# Altium footprint library B105rlc.PcbLib: 103 footprints (part 6 of 7)
Each footprint in its own frame and in the unit in brackets; x right, y up, seen from the top. Pads: shape width x height; smd on the part's side, far side on the other; paste and mask are expansions set on the pad; w line width, h text height; cw(c..) or ccw(c..) is an arc to the next point about the centre after c.
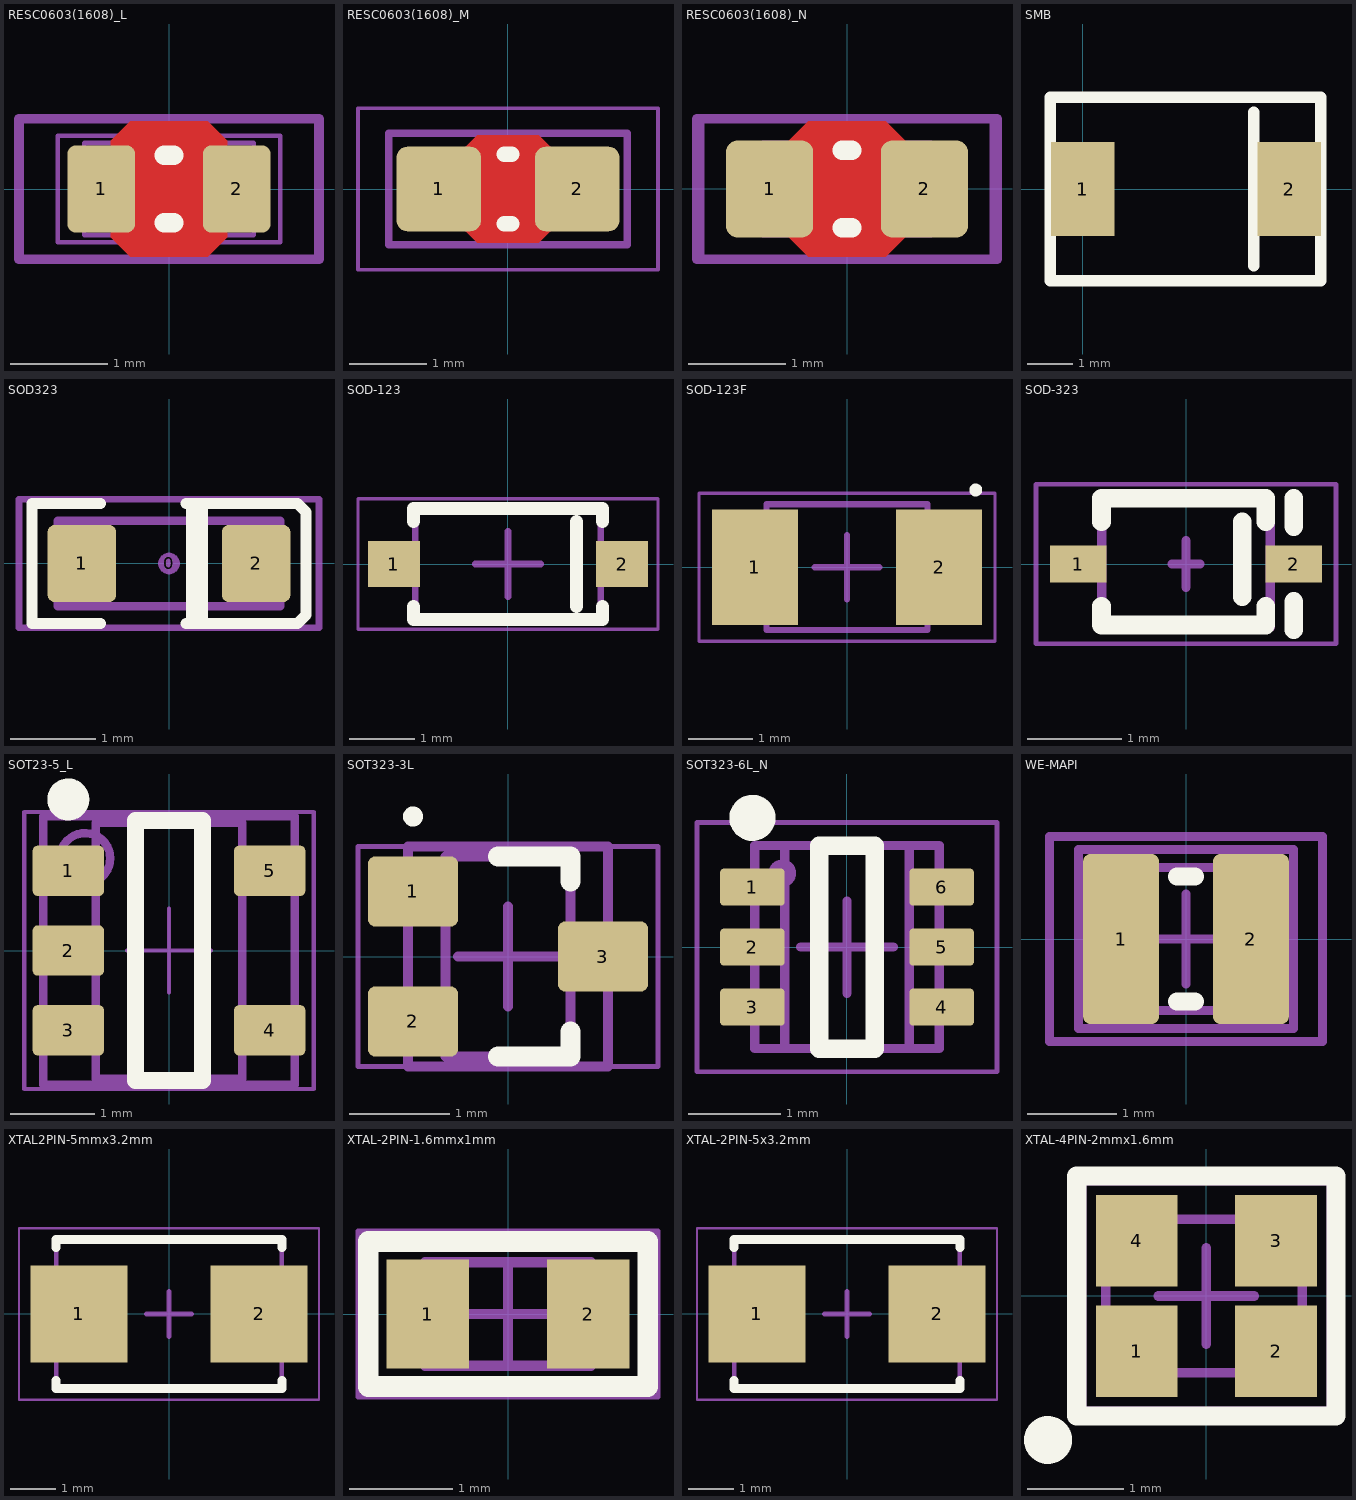
[diagram p5: the footprints below, top view; thin cyan lines are the x and y axes]

## RESC0603(1608)_L [mm] "Chip Resistor, Body 1.6x0.8mm, IPC High Density"
height 0.6
pads (2):
  rrect25% 0.7x0.9 smd: 1(-0.7,0) 2(0.7,0)
Top Layer:
  pour cut-out: -0.6,0.5 -0.4,0.7 0.4,0.7 0.6,0.5 0.6,-0.5 0.4,-0.7 -0.4,-0.7 -0.6,-0.5
Top Overlay:
  lines w0.2: -0.05,-0.35 0.05,-0.35 ; -0.05,0.35 0.05,0.35
Mechanical 5:
  lines w0.1: -1.55,-0.725 -1.55,0.725 1.55,0.725 1.55,-0.725 -1.55,-0.725
  text ".Designator" at -1,-0.381 h0.76
Mechanical 13:
  lines w0.05: -0.875,-0.475 -0.875,0.475 -0.475,0.475 -0.475,-0.475 -0.875,-0.475 ; -0.475,-0.474 0.475,-0.474 -0.475,-0.474 ; -0.475,0.474 0.475,0.474 -0.475,0.474 ; 0.475,-0.475 0.875,-0.475 0.875,0.475 0.475,0.475 0.475,-0.475
Mechanical 15:
  lines w0.05: -0.475,0 0.475,0 ; 0,-0.475 0,0.475 ; -1.15,-0.55 1.15,-0.55 1.15,0.55 -1.15,0.55 -1.15,-0.55
3D body "RES 0603 (1608 metric).STEP": height 0.54, standoff -0.01, extent -0.875,-0.475 0.875,0.475

## RESC0603(1608)_M [mm] "Chip Resistor, Body 1.6x0.8mm, IPC Low Density"
height 0.6
pads (2):
  rrect25% 1.1x1.1 smd: 1(-0.9,0) 2(0.9,0)
Top Layer:
  pour cut-out: -0.6,0.5 -0.4,0.7 0.4,0.7 0.6,0.5 0.6,-0.5 0.4,-0.7 -0.4,-0.7 -0.6,-0.5
Top Overlay:
  lines w0.2: -0.05,-0.45 0.05,-0.45 ; -0.05,0.45 0.05,0.45
Mechanical 5:
  lines w0.1: -1.55,-0.725 1.55,-0.725 1.55,0.725 -1.55,0.725 -1.55,-0.725
  text ".Designator" at -1,-0.381 h0.76
Mechanical 13:
  lines w0.05: -0.875,-0.475 -0.475,-0.475 -0.475,0.475 -0.875,0.475 -0.875,-0.475 ; -0.475,-0.474 0.475,-0.474 -0.475,-0.474 ; -0.475,0.474 0.475,0.474 -0.475,0.474 ; 0.475,-0.475 0.475,0.475 0.875,0.475 0.875,-0.475 0.475,-0.475
Mechanical 15:
  lines w0.05: -0.475,0 0.475,0 ; 0,-0.475 0,0.475 ; -1.95,-1.05 -1.95,1.05 1.95,1.05 1.95,-1.05 -1.95,-1.05
3D body "RES 0603 (1608 metric).STEP": height 0.54, standoff -0.01, extent -0.875,-0.475 0.875,0.475

## RESC0603(1608)_N [mm]
pads (2):
  rrect25% 0.9x1 smd: 1(-0.8,0) 2(0.8,0)
Top Layer:
  pour cut-out: -0.6,0.5 -0.4,0.7 0.4,0.7 0.6,0.5 0.6,-0.5 0.4,-0.7 -0.4,-0.7 -0.6,-0.5
Top Overlay:
  lines w0.2: -0.05,-0.4 0.05,-0.4 ; -0.05,0.4 0.05,0.4
Mechanical 5:
  lines w0.1: -1.55,-0.725 1.55,-0.725 1.55,0.725 -1.55,0.725 -1.55,-0.725
  text ".Designator" at 1,0.4 h0.76
Mechanical 13:
  lines w0.05: -0.875,-0.475 -0.875,0.475 -0.475,0.475 -0.475,-0.475 -0.875,-0.475 ; -0.475,-0.474 0.475,-0.474 -0.475,-0.474 ; -0.475,0.474 0.475,0.474 -0.475,0.474 ; 0.475,-0.475 0.875,-0.475 0.875,0.475 0.475,0.475 0.475,-0.475
Mechanical 15:
  lines w0.05: -0.475,0 0.475,0 ; 0,-0.475 0,0.475 ; -1.5,-0.75 1.5,-0.75 1.5,0.75 -1.5,0.75 -1.5,-0.75
3D body "RES 0603 (1608 metric).STEP": height 0.54, standoff -0.01, extent -0.875,-0.475 0.875,0.475

## SMB [mm]
pads (2):
  rect 1.41x2.08 smd: 1(0,0) 2(4.572,0)
Top Overlay:
  lines w0.254: 3.786,-1.7 3.786,1.7 ; -0.724,-2.032 -0.724,2.032 5.276,2.032 5.276,-2.032 -0.724,-2.032
3D body "User Library-DO-214AA_SMB.step": height 2.2, standoff -0.05, extent -0.364,-1.85 4.936,1.85

## SOD323 [mm]
pads (3):
  round 0.254 on Mech15: 0(0,0)
  rrect20% 0.8x0.9 smd: 1(-1.016,0) 2(1.016,0)
Top Overlay:
  rectangle: 0.2,-0.762 0.454,0.7
  lines w0.127: -0.8,-0.7 -1.6,-0.7 -1.6,0.7 -0.8,0.7 ; 0.2,-0.7 1.5,-0.7 1.6,-0.6 1.6,0.6 1.5,0.7 0.2,0.7
Mechanical 5:
  lines w0.1: 1.1,-0.3 1.1,0.3 ; -1.3,-0.5 -1.3,0.5 1.3,0.5 1.3,-0.5 -1.3,-0.5
  text ".Designator" at -0.9,-0.3 h0.64
Mechanical 15:
  lines w0.076: -1.75,-0.75 1.75,-0.75 1.75,0.75 -1.75,0.75 -1.75,-0.75
3D body "SOD-323.STEP": height 1.1, standoff 0, extent -1.305,-0.675 1.295,0.675

## SOD-123 [mm] "SODFL, 2-Leads, Body 1,55x3,70mm, IPC Medium Density"
height 1.1
pads (2):
  rect 0.8x0.7 smd: 1(-1.75,0) 2(1.75,0)
Top Overlay:
  lines w0.2: -1.45,-0.65 -1.45,-0.85 1.45,-0.85 1.45,-0.65 ; -1.45,0.65 -1.45,0.85 1.45,0.85 1.45,0.65 ; 1.05,-0.65 1.05,0.65
Mechanical 13:
  lines w0.1: -1.425,-0.85 -1.425,0.85 1.425,0.85 1.425,-0.85 -1.425,-0.85
Mechanical 15:
  lines w0.05: -2.3,-1 -2.3,1 2.3,1 2.3,-1 -2.3,-1
  lines w0.1: -0.5,0 0.5,0 ; 0,-0.5 0,0.5
3D body "SOD-123_DiodesInc.step": height 1.42, standoff -0.03, extent -1.925,-0.85 1.925,0.85

## SOD-123F [mm] "SODFL, 2-Leads, Body 1,72x3,60mm, IPC Medium Density"
height 1.08
pads (2):
  rect 1.34x1.8 smd: 1(-1.43,0) 2(1.43,0)
Top Overlay:
  circle w0.1: c2,1.2 r0.05
Mechanical 13:
  lines w0.1: -1.25,-0.975 1.25,-0.975 1.25,0.975 -1.25,0.975 -1.25,-0.975
Mechanical 15:
  lines w0.05: -2.3,-1.15 2.3,-1.15 2.3,1.15 -2.3,1.15 -2.3,-1.15
  lines w0.1: -0.5,0 0.5,0 ; 0,-0.5 0,0.5
3D body "SOD123F.STEP": height 1.2, standoff -0.01, extent -1.875,-0.85 1.875,0.85

## SOD-323 [mm]
pads (2):
  rect 0.6x0.4 smd: 1(-1.15,0) 2(1.15,0)
Top Overlay:
  lines w0.2: -0.9,-0.45 -0.9,-0.65 0.85,-0.65 0.85,-0.45 ; -0.9,0.45 -0.9,0.7 0.85,0.7 0.85,0.45 ; 0.6,-0.35 0.6,0.45 ; 1.15,-0.7 1.15,-0.4 ; 1.15,0.4 1.15,0.7
Mechanical 13:
  lines w0.1: -0.9,-0.675 -0.9,0.675 0.9,0.675 0.9,-0.675 -0.9,-0.675
Mechanical 15:
  lines w0.05: -1.6,-0.85 -1.6,0.85 1.6,0.85 1.6,-0.85 -1.6,-0.85
  lines w0.1: -0.15,0 0.15,0 ; 0,-0.25 0,0.25
3D body "User Library-SOD323-1.step": height 1.1, standoff 0, extent -1.3,-0.675 1.3,0.675

## SOT23-5_L [mm]
pads (5):
  rrect20% 0.85x0.6 smd: 1(-1.2,0.95) 2(-1.2,0) 3(-1.2,-0.95) 4(1.2,-0.95) 5(1.2,0.95)
Top Overlay:
  circle w0.25: c-1.2,1.8 r0.125
  lines w0.2: -0.4,-1.55 0.4,-1.55 0.4,1.55 -0.4,1.55 -0.4,-1.55
Mechanical 5:
  circle w0.1: c-1,1.1 r0.3
  lines w0.1: -1.5,-1.6 1.5,-1.6 1.5,1.6 -1.5,1.6 -1.5,-1.6
  text ".Designator" at 0.5,-0.875 h1.02
Mechanical 13:
  circle w0.15: c-1.2,1.8 r0.1
  lines w0.1: -0.875,-1.525 -0.875,1.525 0.875,1.525 0.875,-1.525 -0.875,-1.525
Mechanical 15:
  lines w0.05: -0.5,0 0.5,0 ; 0,-0.5 0,0.5 ; -1.725,-1.65 -1.725,1.65 1.725,1.65 1.725,-1.65 -1.725,-1.65
3D body "DBV0005A.stp": height 1.08, standoff -0.01, extent -1.422,-1.461 1.423,1.461

## SOT323-3L [mm]
pads (3):
  rrect20% 0.9x0.7 smd: 1(-0.95,0.65) 2(-0.95,-0.65) 3(0.95,0)
Top Overlay:
  circle w0.1: c-0.95,1.4 r0.05
  lines w0.2: -0.1,-1 0.625,-1 0.625,-0.75 ; -0.1,1 0.625,1 0.625,0.75
Mechanical 5:
  circle w0.1: c-0.7,0.8 r0.1
  lines w0.1: -1,-1.1 -1,1.1 1,1.1 1,-1.1 -1,-1.1
  text ".Designator" at -0.6,-0.5 h1.02
Mechanical 13:
  lines w0.1: -0.625,-1 -0.625,1 0.625,1 0.625,-1 -0.625,-1
Mechanical 15:
  lines w0.05: -1.5,-1.1 -1.5,1.1 1.5,1.1 1.5,-1.1 -1.5,-1.1
  lines w0.1: -0.5,0 0.5,0 ; 0,-0.5 0,0.5
3D body: height 1, standoff 0, extent -0.625,-1 0.625,1

## SOT323-6L_N [mm]
pads (6):
  rrect20% 0.7x0.4 smd: 1(-1.025,0.65) 2(-1.025,0) 3(-1.025,-0.65) 4(1.025,-0.65) 5(1.025,0) 6(1.025,0.65)
Top Overlay:
  circle w0.25: c-1.025,1.4 r0.125
  lines w0.2: -0.3,-1.1 -0.3,1.1 0.3,1.1 0.3,-1.1 -0.3,-1.1
Mechanical 5:
  circle w0.1: c-0.7,0.8 r0.1
  lines w0.1: -1,-1.1 -1,1.1 1,1.1 1,-1.1 -1,-1.1
  text ".Designator" at 0.725,0.325 h0.6
Mechanical 13:
  lines w0.1: -0.675,-1.1 0.675,-1.1 0.675,1.1 -0.675,1.1 -0.675,-1.1
Mechanical 15:
  lines w0.05: -1.625,-1.35 1.625,-1.35 1.625,1.35 -1.625,1.35 -1.625,-1.35
  lines w0.1: -0.5,0 0.5,0 ; 0,-0.5 0,0.5
3D body "UMZ12NT106.stp": height 0.9, standoff -0.05, extent -1.05,-1 1.05,1

## WE-MAPI [mm]
pads (2):
  rrect20% 0.85x1.9 smd: 1(-0.725,0) 2(0.725,0)
Top Overlay:
  lines w0.2: -0.1,-0.7 0.1,-0.7 ; -0.1,0.7 0.1,0.7
Mechanical 5:
  lines w0.1: -1.2,-1 1.2,-1 1.2,1 -1.2,1 -1.2,-1
  text ".Designator" at -0.3,0.3 h0.46
Mechanical 13:
  lines w0.1: -1,-0.8 1,-0.8 1,0.8 -1,0.8 -1,-0.8
Mechanical 15:
  lines w0.1: -0.5,0 0.5,0 ; 0,-0.5 0,0.5 ; -1.524,-1.143 1.524,-1.143 1.524,1.143 -1.524,1.143 -1.524,-1.143
3D body: height 1, standoff 0, extent -1,-0.8 -0.3,0.8
3D body: height 1, standoff 0, extent 0.3,-0.8 1,0.8
3D body: height 1, standoff 0, extent -0.3,-0.8 0.3,0.8

## XTAL2PIN-5mmx3.2mm [mm] "Molded Capacitor, 2-Leads, Body 5,00x3,20mm, IPC Medium Density"
height 1.2
pads (2):
  rect 2.15x2.15 smd: 1(-2,0) 2(2,0)
Top Overlay:
  lines w0.2: -2.5,-1.475 -2.5,-1.65 2.5,-1.65 2.5,-1.475 ; -2.5,1.475 -2.5,1.65 2.5,1.65 2.5,1.475
Mechanical 13:
  lines w0.1: -2.5,-1.6 2.5,-1.6 2.5,1.6 -2.5,1.6 -2.5,-1.6
Mechanical 15:
  lines w0.05: -3.325,-1.9 3.325,-1.9 3.325,1.9 -3.325,1.9 -3.325,-1.9
  lines w0.1: -0.5,0 0.5,0 ; 0,-0.5 0,0.5
3D body "445-CRYTAL-SMD-5x3.2mm.step": height 1.35, standoff 0, extent -2.495,-1.6 2.505,1.6

## XTAL-2PIN-1.6mmx1mm [mm] "Chip XTAL 2-Leads, Body 1,60x1,00mm, IPC Medium Density"
height 0.5
pads (2):
  rect 0.8x1.05 smd: 1(-0.775,0) 2(0.775,0)
Top Overlay:
  lines w0.2: -1.35,-0.7 -1.35,0.7 1.35,0.7 1.35,-0.7 -1.35,-0.7
Mechanical 13:
  lines w0.1: -0.8,-0.5 0.8,-0.5 0.8,0.5 -0.8,0.5 -0.8,-0.5
Mechanical 15:
  lines w0.05: -1.45,-0.8 1.45,-0.8 1.45,0.8 -1.45,0.8 -1.45,-0.8
  lines w0.1: -0.5,0 0.5,0 ; 0,-0.5 0,0.5
3D body "XTAL-ABS05.step": height 0.5, standoff 0, extent -0.8,-0.5 0.8,0.5

## XTAL-2PIN-5x3.2mm [mm] "Molded Capacitor, 2-Leads, Body 5,00x3,20mm, IPC Medium Density"
height 1.2
pads (2):
  rect 2.15x2.15 smd: 1(-2,0) 2(2,0)
Top Overlay:
  lines w0.2: -2.5,-1.475 -2.5,-1.65 2.5,-1.65 2.5,-1.475 ; -2.5,1.475 -2.5,1.65 2.5,1.65 2.5,1.475
Mechanical 13:
  lines w0.1: -2.5,-1.6 2.5,-1.6 2.5,1.6 -2.5,1.6 -2.5,-1.6
Mechanical 15:
  lines w0.05: -3.325,-1.9 3.325,-1.9 3.325,1.9 -3.325,1.9 -3.325,-1.9
  lines w0.1: -0.5,0 0.5,0 ; 0,-0.5 0,0.5
3D body "445-CRYTAL-SMD-5x3.2mm.step": height 1.35, standoff 0, extent -2.495,-1.6 2.505,1.6

## XTAL-4PIN-2mmx1.6mm [mm] "XTAL-4PIN-2mmx1.6mm"
height 1
pads (4):
  rect 0.85x0.95 smd: 1(-0.725,-0.575) 2(0.725,-0.575) 3(0.725,0.575) 4(-0.725,0.575)
Top Overlay:
  circle w0.25: c-1.65,-1.5 r0.125
  lines w0.2: -1.35,-1.25 1.35,-1.25 1.35,1.25 -1.35,1.25 -1.35,-1.25
Mechanical 13:
  lines w0.1: -1.05,-0.8 -1.05,0.8 1,0.8 1,-0.8 -1.05,-0.8
Mechanical 15:
  lines w0.05: -1.275,-1.175 -1.275,1.175 1.275,1.175 1.275,-1.175 -1.275,-1.175
  lines w0.1: -0.5,0 0.5,0 ; 0,-0.5 0,0.5
3D body "XTAL2x1-6.step": height 0.65, standoff 0, extent -1,-0.8 1,0.8